# Altium footprint library LION.PcbLib: 90 footprints (part 8 of 13) (continued)
## FFG1158 [mil] "FFG1158" (continued)
  lines w15: -669.3,-551.2 -649.6,-531.5 ; -669.3,-393.7 -649.6,-374 ; -669.3,-157.5 -649.6,-137.8 ; -669.3,39.4 -649.6,19.7 ; -669.3,275.6 -649.6,255.9 ; -669.3,433.1 -649.6,413.4 ; -669.3,669.3 -649.6,649.6 ; -669.25,-629.85 -649.6,-610.2 ; -669.25,-472.45 -649.6,-452.8 ; -669.25,-314.95 -649.6,-295.3 ; -669.25,-236.15 -649.6,-216.5 ; -669.25,-78.75 -649.6,-59.1 ; -669.25,118.05 -649.6,98.4 ; -669.25,196.85 -649.6,177.2 ; -669.25,354.25 -649.6,334.6 ; -669.25,511.75 -649.6,492.1 ; -669.25,590.55 -649.6,570.9 ; -629.85,-629.85 -610.2,-610.2 ; -629.85,-551.15 -610.2,-531.5 ; -629.85,-472.45 -610.2,-452.8 ; -629.85,-393.65 -610.2,-374 ; -629.85,-314.95 -610.2,-295.3 ; -629.85,-236.15 -610.2,-216.5 ; -629.85,-157.45 -610.2,-137.8 ; -629.85,-78.75 -610.2,-59.1 ; -629.85,39.35 -610.2,19.7 ; -629.85,196.85 -610.2,177.2 ; -629.85,275.55 -610.2,255.9 ; -629.85,354.25 -610.2,334.6 ; -629.85,433.05 -610.2,413.4 ; -629.85,511.75 -610.2,492.1 ; -629.85,590.55 -610.2,570.9 ; -629.85,669.25 -610.2,649.6 ; -600.15,-1515.23 -571.15,-1515.23 ; -600.15,-1475.87 -571.15,-1475.87 ; -600.15,-1436.51 -571.15,-1436.51 ; -590.55,-669.25 -570.9,-649.6 ; -590.55,-590.55 -570.9,-570.9 ; -590.55,-511.75 -570.9,-492.1 ; -590.55,-433.05 -570.9,-413.4 ; -590.55,-354.25 -570.9,-334.6 ; -590.55,-275.55 -570.9,-255.9 ; -590.55,-196.85 -570.9,-177.2 ; -590.55,-118.05 -570.9,-98.4 ; -590.55,-39.35 -570.9,-19.7 ; -590.55,157.45 -570.9,137.8 ; -590.55,236.15 -570.9,216.5 ; -590.55,314.95 -570.9,295.3 ; -590.55,393.65 -570.9,374 ; -590.55,472.45 -570.9,452.8 ; -590.55,551.15 -570.9,531.5 ; -590.55,629.85 -570.9,610.2 ; -551.2,-669.3 -531.5,-649.6 ; -551.2,-433.1 -531.5,-413.4 ; -551.2,-275.6 -531.5,-255.9 ; -551.2,-39.4 -531.5,-19.7 ; -551.2,157.5 -531.5,137.8 ; -551.2,393.7 -531.5,374 ; -551.2,551.2 -531.5,531.5 ; -551.15,-590.55 -531.5,-570.9 ; -551.15,-511.75 -531.5,-492.1 ; -551.15,-354.25 -531.5,-334.6 ; -551.15,-196.85 -531.5,-177.2 ; -551.15,-118.05 -531.5,-98.4 ; -551.15,78.75 -531.5,59.1 ; -551.15,236.15 -531.5,216.5 ; -551.15,314.95 -531.5,295.3 ; -551.15,472.45 -531.5,452.8 ; -551.15,629.85 -531.5,610.2 ; -531.15,-1515.23 -502.15,-1515.23 ; -531.15,-1436.51 -502.15,-1436.51 ; -531.15,-1082.27 -502.15,-1082.27 ; -531.15,-1042.91 -502.15,-1042.91 ; -511.75,-629.85 -492.1,-610.2 ; -511.75,-551.15 -492.1,-531.5 ; -511.75,-472.45 -492.1,-452.8 ; -511.75,-393.65 -492.1,-374 ; -511.75,-314.95 -492.1,-295.3 ; -511.75,-236.15 -492.1,-216.5 ; -511.75,-157.45 -492.1,-137.8 ; -511.75,-78.75 -492.1,-59.1 ; -511.75,39.35 -492.1,19.7 ; -511.75,118.05 -492.1,98.4 ; -511.75,196.85 -492.1,177.2 ; -511.75,275.55 -492.1,255.9 ; -511.75,354.25 -492.1,334.6 ; -511.75,433.05 -492.1,413.4 ; -511.75,511.75 -492.1,492.1 ; -511.75,590.55 -492.1,570.9 ; -511.75,669.25 -492.1,649.6 ; -508.46,-1723.26 -508.46,-1684.26 ; -508.46,-1644.26 -508.46,-1605.26 ; -472.45,-629.85 -452.8,-610.2 ; -472.45,-551.15 -452.8,-531.5 ; -472.45,-472.45 -452.8,-452.8 ; -472.45,-393.65 -452.8,-374 ; -472.45,-314.95 -452.8,-295.3 ; -472.45,-236.15 -452.8,-216.5 ; -472.45,-157.45 -452.8,-137.8 ; -472.45,-78.75 -452.8,-59.1 ; -472.45,39.35 -452.8,19.7 ; -472.45,118.05 -452.8,98.4 ; -472.45,196.85 -452.8,177.2 ; -472.45,275.55 -452.8,255.9 ; -472.45,354.25 -452.8,334.6 ; -472.45,433.05 -452.8,413.4 ; -472.45,511.75 -452.8,492.1 ; -472.45,590.55 -452.8,570.9 ; -472.45,669.25 -452.8,649.6 ; -468.46,-1723.26 -468.46,-1684.26 ; -468.46,-1644.26 -468.46,-1605.26 ; -433.1,-669.3 -413.4,-649.6 ; -433.1,-551.2 -413.4,-531.5 ; -433.1,-433.1 -413.4,-413.4 ; -433.1,-393.7 -413.4,-374 ; -433.1,-275.6 -413.4,-255.9 ; -433.1,-39.4 -413.4,-19.7 ; -433.1,157.5 -413.4,137.8 ; -433.1,393.7 -413.4,374 ; -433.1,551.2 -413.4,531.5 ; -433.1,669.3 -413.4,649.6 ; -433.05,-629.85 -413.4,-610.2 ; -433.05,-590.55 -413.4,-570.9 ; -433.05,-511.75 -413.4,-492.1 ; -433.05,-472.45 -413.4,-452.8 ; -433.05,-354.25 -413.4,-334.6 ; -433.05,-196.85 -413.4,-177.2 ; -433.05,-118.05 -413.4,-98.4 ; -433.05,78.75 -413.4,59.1 ; -433.05,236.15 -413.4,216.5 ; -433.05,314.95 -413.4,295.3 ; -433.05,472.45 -413.4,452.8 ; -433.05,511.75 -413.4,492.1 ; -433.05,590.55 -413.4,570.9 ; -433.05,629.85 -413.4,610.2 ; -393.7,-669.3 -374,-649.6 ; -393.7,-433.1 -374,-413.4 ; -393.7,-393.7 -374,-374 ; -393.7,-275.6 -374,-255.9 ; -393.7,-39.4 -374,-19.7 ; -393.7,157.5 -374,137.8 ; -393.7,393.7 -374,374 ; -393.7,433.1 -374,413.4 ; -393.7,551.2 -374,531.5 ; -393.65,-472.45 -374,-452.8 ; -393.65,-354.25 -374,-334.6 ; -393.65,-196.85 -374,-177.2 ; -393.65,-118.05 -374,-98.4 ; -393.65,78.75 -374,59.1 ; -393.65,236.15 -374,216.5 ; -393.65,314.95 -374,295.3 ; -393.65,472.45 -374,452.8 ; -354.4,-1377.49 -334.72,-1357.81 ; -354.4,-1180.65 -334.72,-1200.33 ; -354.25,-590.55 -334.6,-570.9 ; -354.25,-433.05 -334.6,-413.4 ; -354.25,-393.65 -334.6,-374 ; -354.25,-354.25 -334.6,-334.6 ; -354.25,-314.95 -334.6,-295.3 ; -354.25,-275.55 -334.6,-255.9 ; -354.25,-236.15 -334.6,-216.5 ; -354.25,-196.85 -334.6,-177.2 ; -354.25,-157.45 -334.6,-137.8 ; -354.25,-118.05 -334.6,-98.4 ; -354.25,-78.75 -334.6,-59.1 ; -354.25,-39.35 -334.6,-19.7 ; -354.25,39.35 -334.6,19.7 ; -354.25,78.75 -334.6,59.1 ; -354.25,118.05 -334.6,98.4 ; -354.25,157.45 -334.6,137.8 ; -354.25,196.85 -334.6,177.2 ; -354.25,236.15 -334.6,216.5 ; -354.25,275.55 -334.6,255.9 ; -354.25,314.95 -334.6,295.3 ; -354.25,354.25 -334.6,334.6 ; -354.25,393.65 -334.6,374 ; -354.25,433.05 -334.6,413.4 ; -354.25,472.45 -334.6,452.8 ; -354.25,629.85 -345.3,620.9 ; -315.03,-1377.49 -295.35,-1357.81 ; -315.03,-1338.12 -295.35,-1318.44 ; -315.03,-1298.75 -295.35,-1279.07 ; -315.03,-1220.02 -295.35,-1239.7 ; -315.03,-1180.65 -295.35,-1200.33 ; -314.95,-511.75 -295.3,-492.1 ; -314.95,-433.05 -295.3,-413.4 ; -314.95,-275.55 -295.3,-255.9 ; -314.95,-236.15 -295.3,-216.5 ; -314.95,118.05 -295.3,98.4 ; -314.95,314.95 -295.3,295.3 ; -275.66,-1377.49 -255.98,-1357.81 ; -275.66,-1338.12 -255.98,-1318.44 ; -275.66,-1298.75 -255.98,-1279.07 ; -275.66,-1220.02 -255.98,-1239.7 ; -275.66,-1180.65 -255.98,-1200.33 ; -275.6,-433.1 -255.9,-413.4 ; -275.6,-275.6 -255.9,-255.9 ; -275.6,-157.5 -255.9,-137.8 ; -275.6,-39.4 -255.9,-19.7 ; -275.6,39.4 -255.9,19.7 ; -275.55,-629.85 -255.9,-610.2 ; -275.55,-196.85 -255.9,-177.2 ; -275.55,-118.05 -255.9,-98.4 ; -275.55,-78.75 -255.9,-59.1 ; -275.55,78.75 -255.9,59.1 ; -275.55,196.85 -255.9,177.2 ; -275.55,590.55 -255.9,570.9 ; -236.29,-1377.49 -216.61,-1357.81 ; -236.29,-1298.75 -216.61,-1279.07 ; -236.29,-1180.65 -216.61,-1200.33 ; -236.15,-551.15 -216.5,-531.5 ; -236.15,-354.25 -216.5,-334.6 ; -236.15,-275.55 -216.5,-255.9 ; -236.15,-236.15 -216.5,-216.5 ; -236.15,-196.85 -216.5,-177.2 ; -236.15,-157.45 -216.5,-137.8 ; -236.15,-118.05 -216.5,-98.4 ; -236.15,-78.75 -216.5,-59.1 ; -236.15,-39.35 -216.5,-19.7 ; -236.15,39.35 -216.5,19.7 ; -236.15,78.75 -216.5,59.1 ; -236.15,118.05 -216.5,98.4 ; -236.15,472.45 -216.5,452.8 ; -196.92,-1377.49 -177.24,-1357.81 ; -196.92,-1298.75 -177.24,-1279.07 ; -196.92,-1180.65 -177.24,-1200.33 ; -196.85,-669.25 -177.2,-649.6 ; -196.85,-472.45 -177.2,-452.8 ; -196.85,-236.15 -177.2,-216.5 ; -196.85,-157.45 -177.2,-137.8 ; -196.85,-78.75 -177.2,-59.1 ; -196.85,39.35 -177.2,19.7 ; -196.85,78.75 -177.2,59.1 ; -196.85,354.25 -177.2,334.6 ; -157.55,-1456.23 -137.87,-1436.55 ; -157.55,-1416.86 -137.87,-1397.18 ; -157.55,-1377.49 -137.87,-1357.81 ; -157.55,-1298.75 -137.87,-1279.07 ; -157.55,-1180.65 -137.87,-1200.33 ; -157.55,-1141.28 -137.87,-1160.96 ; -157.55,-1101.91 -137.87,-1121.59 ; -157.5,-393.7 -137.8,-374 ; -157.5,-39.4 -137.8,-19.7 ; -157.5,39.4 -137.8,19.7 ; -157.45,-590.55 -137.8,-570.9 ; -157.45,-472.45 -137.8,-452.8 ; -157.45,-196.85 -137.8,-177.2 ; -157.45,-118.05 -137.8,-98.4 ; -157.45,78.75 -137.8,59.1 ; -157.45,118.05 -137.8,98.4 ; -157.45,236.15 -137.8,216.5 ; -157.45,629.85 -137.8,610.2 ; -118.05,-511.75 -98.4,-492.1 ; -118.05,-314.95 -98.4,-295.3 ; -118.05,-275.55 -98.4,-255.9 ; -118.05,-236.15 -98.4,-216.5 ; -118.05,-196.85 -98.4,-177.2 ; -118.05,-157.45 -98.4,-137.8 ; -118.05,-118.05 -98.4,-98.4 ; -118.05,-78.75 -98.4,-59.1 ; -118.05,-39.35 -98.4,-19.7 ; -118.05,39.35 -98.4,19.7 ; -118.05,78.75 -98.4,59.1 ; -118.05,118.05 -98.4,98.4 ; -118.05,511.75 -98.4,492.1 ; -98.5,-1357.81 -78.82,-1377.49 ; -98.5,-1279.07 -78.82,-1298.75 ; -98.5,-1200.33 -78.82,-1180.65 ; -78.75,-629.85 -59.1,-610.2 ; -78.75,-433.05 -59.1,-413.4 ; -78.75,-393.65 -59.1,-374 ; -78.75,-236.15 -59.1,-216.5 ; -78.75,-196.85 -59.1,-177.2 ; -78.75,-157.45 -59.1,-137.8 ; -78.75,-118.05 -59.1,-98.4 ; -78.75,-78.75 -59.1,-59.1 ; -78.75,-39.35 -59.1,-19.7 ; -78.75,39.35 -59.1,19.7 ; -78.75,78.75 -59.1,59.1 ; -78.75,118.05 -59.1,98.4 ; -78.75,393.65 -59.1,374 ; -78.75,590.55 -69.7,581.5 ; -59.13,-1357.81 -39.45,-1377.49 ; -59.13,-1279.07 -39.45,-1298.75 ; -59.13,-1200.33 -39.45,-1180.65 ; -39.4,-551.2 -19.7,-531.5 ; -39.4,-275.6 -19.7,-255.9 ; -39.4,39.4 -19.7,19.7 ; -39.4,275.6 -19.7,255.9 ; -39.4,669.3 -19.7,649.6 ; -39.35,-354.25 -19.7,-334.6 ; -39.35,-236.15 -19.7,-216.5 ; -39.35,-196.85 -19.7,-177.2 ; -39.35,78.75 -19.7,59.1 ; -39.35,118.05 -19.7,98.4 ; -19.76,-1357.81 -0.08,-1377.49 ; -19.76,-1318.44 -0.08,-1338.12 ; -19.76,-1279.07 -0.08,-1298.75 ; -19.76,-1239.7 -0.08,-1220.02 ; -19.76,-1200.33 -0.08,-1180.65 ; 19.61,-1357.81 39.29,-1377.49 ; 19.61,-1318.44 39.29,-1338.12 ; 19.61,-1279.07 39.29,-1298.75 ; 19.61,-1239.7 39.29,-1220.02 ; 19.61,-1200.33 39.29,-1180.65 ; 19.7,-649.6 39.4,-669.3 ; 19.7,-452.8 39.35,-472.45 ; 19.7,-216.5 39.35,-236.15 ; 19.7,-177.2 39.35,-196.85 ; 19.7,19.7 39.4,39.4 ; 19.7,59.1 39.35,78.75 ; 19.7,98.4 39.35,118.05 ; 19.7,137.8 39.4,157.5 ; 19.7,531.5 39.4,551.2 ; 58.98,-1357.81 78.66,-1377.49 ; 58.98,-1200.33 78.66,-1180.65 ; 59.1,-570.9 78.75,-590.55 ; 59.1,-374 78.75,-393.65 ; 59.1,-255.9 78.75,-275.55 ; 59.1,-216.5 78.75,-236.15 ; 59.1,-177.2 78.75,-196.85 ; 59.1,-137.8 78.75,-157.45 ; 59.1,-98.4 78.75,-118.05 ; 59.1,-59.1 78.75,-78.75 ; 59.1,-19.7 78.75,-39.35 ; 59.1,19.7 78.75,39.35 ; 59.1,59.1 78.75,78.75 ; 59.1,98.4 78.75,118.05 ; 59.1,413.4 78.75,433.05 ; 98.4,-492.1 118.05,-511.75 ; 98.4,-295.3 118.05,-314.95 ; 98.4,-255.9 118.05,-275.55 ; 98.4,-177.2 118.05,-196.85 ; 98.4,-98.4 118.05,-118.05 ; 98.4,-19.7 118.05,-39.35 ; 98.4,59.1 118.05,78.75 ; 98.4,98.4 118.05,118.05 ; 98.4,295.3 118.05,314.95 ; 137.8,-610.2 157.45,-629.85 ; 137.8,-413.4 157.5,-433.1 ; 137.8,-374 157.5,-393.7 ; 137.8,-255.9 157.5,-275.6 ; 137.8,-216.5 157.45,-236.15 ; 137.8,-177.2 157.45,-196.85 ; 137.8,-137.8 157.5,-157.5 ; 137.8,-98.4 157.45,-118.05 ; 137.8,-59.1 157.45,-78.75 ; 137.8,19.7 157.5,39.4 ; 137.8,59.1 157.45,78.75 ; 137.8,98.4 157.45,118.05 ; 137.8,177.2 157.45,196.85 ; 137.8,570.9 157.45,590.55 ; 177.2,-531.5 196.85,-551.15 ; 177.2,-334.6 196.85,-354.25 ; 177.2,-255.9 196.85,-275.55 ; 177.2,-216.5 196.85,-236.15 ; 177.2,-177.2 196.85,-196.85 ; 177.2,-137.8 196.85,-157.45 ; 177.2,-98.4 196.85,-118.05 ; 177.2,-59.1 196.85,-78.75 ; 177.2,-19.7 196.85,-39.35 ; 177.2,19.7 196.85,39.35 ; 177.2,59.1 196.85,78.75 ; 177.2,98.4 196.85,118.05 ; 177.2,452.8 196.85,472.45 ; 216.5,-649.6 236.15,-669.25 ; 216.5,-452.8 236.15,-472.45 ; 216.5,-255.9 236.15,-275.55 ; 216.5,-216.5 236.15,-236.15 ; 216.5,-177.2 236.15,-196.85 ; 216.5,-137.8 236.15,-157.45 ; 216.5,-98.4 236.15,-118.05 ; 216.5,-59.1 236.15,-78.75 ; 216.5,-19.7 236.15,-39.35 ; 216.5,19.7 236.15,39.35 ; 216.5,59.1 236.15,78.75 ; 216.5,334.6 236.15,354.25 ; 216.5,531.5 236.15,551.15 ; 255.9,-570.9 275.55,-590.55 ; 255.9,-374 275.6,-393.7 ; 255.9,-255.9 275.6,-275.6 ; 255.9,-216.5 275.55,-236.15 ; 255.9,-177.2 275.55,-196.85 ; 255.9,-137.8 275.6,-157.5 ; 255.9,-98.4 275.55,-118.05 ; 255.9,-59.1 275.55,-78.75 ; 255.9,-19.7 275.6,-39.4 ; 255.9,19.7 275.6,39.4 ; 255.9,59.1 275.55,78.75 ; 255.9,98.4 275.55,118.05 ; 255.9,216.5 275.55,236.15 ; 255.9,610.2 275.55,629.85 ; 295.3,-492.1 314.95,-511.75 ; 295.3,-295.3 314.95,-314.95 ; 295.3,-255.9 314.95,-275.55 ; 295.3,-216.5 314.95,-236.15 ; 295.3,59.1 314.95,78.75 ; 295.3,492.1 314.95,511.75 ; 324.81,-1475.87 353.81,-1475.87 ; 324.81,-1436.51 353.81,-1436.51 ; 324.81,-1397.15 353.81,-1397.15 ; 324.81,-1357.79 353.81,-1357.79 ; 324.81,-1318.43 353.81,-1318.43 ; 324.81,-1239.71 353.81,-1239.71 ; 324.81,-1200.35 353.81,-1200.35 ; 324.81,-1160.99 353.81,-1160.99 ; 324.81,-1121.63 353.81,-1121.63 ; 324.81,-1082.27 353.81,-1082.27 ; 334.6,-610.2 354.25,-629.85 ; 334.6,-413.4 354.25,-433.05 ; 334.6,-374 354.25,-393.65 ; 334.6,-334.6 354.25,-354.25 ; 334.6,-295.3 354.25,-314.95 ; 334.6,-255.9 354.25,-275.55 ; 334.6,-216.5 354.25,-236.15 ; 334.6,-177.2 354.25,-196.85 ; 334.6,-137.8 354.25,-157.45 ; 334.6,-98.4 354.25,-118.05 ; 334.6,-59.1 354.25,-78.75 ; 334.6,-19.7 354.25,-39.35 ; 334.6,19.7 354.25,39.35 ; 334.6,59.1 354.25,78.75 ; 334.6,98.4 354.25,118.05 ; 334.6,137.8 354.25,157.45 ; 334.6,177.2 354.25,196.85 ; 334.6,216.5 354.25,236.15 ; 334.6,255.9 354.25,275.55 ; 334.6,295.3 354.25,314.95 ; 334.6,334.6 354.25,354.25 ; 334.6,374 354.25,393.65 ; 334.6,413.4 354.25,433.05 ; 334.6,452.8 354.25,472.45 ; 374,-531.5 393.7,-551.2 ; 374,-413.4 393.7,-433.1 ; 374,-334.6 393.65,-354.25 ; 374,-255.9 393.7,-275.6 ; 374,-177.2 393.65,-196.85 ; 374,-98.4 393.65,-118.05 ; 374,-19.7 393.7,-39.4 ; 374,59.1 393.65,78.75 ; 374,137.8 393.7,157.5 ; 374,216.5 393.65,236.15 ; 374,295.3 393.65,314.95 ; 374,374 393.7,393.7 ; 374,413.4 393.7,433.1 ; 374,452.8 393.65,472.45 ; 374,649.6 393.7,669.3 ; 393.81,-1475.87 422.81,-1475.87 ; 393.81,-1436.51 422.81,-1436.51 ; 393.81,-1397.15 422.81,-1397.15 ; 393.81,-1357.79 422.81,-1357.79 ; 393.81,-1318.43 422.81,-1318.43 ; 393.81,-1239.71 422.81,-1239.71 ; 393.81,-1200.35 422.81,-1200.35 ; 393.81,-1160.99 422.81,-1160.99 ; 393.81,-1121.63 422.81,-1121.63 ; 393.81,-1082.27 422.81,-1082.27 ; 413.4,-649.6 433.1,-669.3 ; 413.4,-610.2 433.05,-629.85 ; 413.4,-570.9 433.05,-590.55 ; 413.4,-531.5 433.1,-551.2 ; 413.4,-492.1 433.05,-511.75 ; 413.4,-452.8 433.05,-472.45 ; 413.4,-413.4 433.1,-433.1 ; 413.4,-374 433.1,-393.7 ; 413.4,-334.6 433.05,-354.25 ; 413.4,-255.9 433.1,-275.6 ; 413.4,-177.2 433.05,-196.85 ; 413.4,-98.4 433.05,-118.05 ; 413.4,-19.7 433.1,-39.4 ; 413.4,59.1 433.05,78.75 ; 413.4,137.8 433.1,157.5 ; 413.4,216.5 433.05,236.15 ; 413.4,295.3 433.05,314.95 ; 413.4,374 433.1,393.7 ; 413.4,452.8 433.05,472.45 ; 413.4,492.1 433.05,511.75 ; 413.4,531.5 433.1,551.2 ; 413.4,570.9 433.05,590.55 ; 413.4,610.2 433.05,629.85 ; 413.4,649.6 433.1,669.3 ; 452.8,-610.2 472.45,-629.85 ; 452.8,-531.5 472.45,-551.15 ; 452.8,-452.8 472.45,-472.45 ; 452.8,-374 472.45,-393.65 ; 452.8,-295.3 472.45,-314.95 ; 452.8,-216.5 472.45,-236.15 ; 452.8,-137.8 472.45,-157.45 ; 452.8,-59.1 472.45,-78.75 ; 452.8,19.7 472.45,39.35 ; 452.8,98.4 472.45,118.05 ; 452.8,177.2 472.45,196.85 ; 452.8,255.9 472.45,275.55 ; 452.8,334.6 472.45,354.25 ; 452.8,413.4 472.45,433.05 ; 452.8,492.1 472.45,511.75 ; 452.8,570.9 472.45,590.55 ; 452.8,649.6 472.45,669.25 ; 492.1,-610.2 511.75,-629.85 ; 492.1,-531.5 511.75,-551.15 ; 492.1,-452.8 511.75,-472.45 ; 492.1,-374 511.75,-393.65 ; 492.1,-295.3 511.75,-314.95 ; 492.1,-216.5 511.75,-236.15 ; 492.1,-137.8 511.75,-157.45 ; 492.1,-59.1 511.75,-78.75 ; 492.1,19.7 511.75,39.35 ; 492.1,98.4 511.75,118.05 ; 492.1,177.2 511.75,196.85 ; 492.1,255.9 511.75,275.55 ; 492.1,334.6 511.75,354.25 ; 492.1,413.4 511.75,433.05 ; 492.1,492.1 511.75,511.75 ; 492.1,570.9 511.75,590.55 ; 492.1,649.6 511.75,669.25 ; 531.5,-649.6 551.2,-669.3 ; 531.5,-570.9 551.15,-590.55 ; 531.5,-492.1 551.15,-511.75 ; 531.5,-413.4 551.2,-433.1 ; 531.5,-334.6 551.15,-354.25 ; 531.5,-177.2 551.15,-196.85 ; 531.5,-98.4 551.15,-118.05 ; 531.5,-19.7 551.2,-39.4 ; 531.5,59.1 551.15,78.75 ; 531.5,137.8 551.2,157.5 ; 531.5,216.5 551.15,236.15 ; 531.5,295.3 551.15,314.95 ; 531.5,374 551.2,393.7 ; 531.5,452.8 551.15,472.45 ; 531.5,531.5 551.2,551.2 ; 531.5,610.2 551.15,629.85 ; 551.18,-275.55 551.25,-275.55 570.9,-255.9 ; 570.9,-649.6 590.55,-669.25 ; 570.9,-570.9 590.55,-590.55 ; 570.9,-492.1 590.55,-511.75 ; 570.9,-413.4 590.55,-433.05 ; 570.9,-334.6 590.55,-354.25 ; 570.9,-177.2 590.55,-196.85 ; 570.9,-98.4 590.55,-118.05 ; 570.9,-19.7 590.55,-39.35 ; 570.9,59.1 590.55,78.75 ; 570.9,137.8 590.55,157.45 ; 570.9,216.5 590.55,236.15 ; 570.9,295.3 590.55,314.95 ; 570.9,374 590.55,393.65 ; 570.9,452.8 590.55,472.45 ; 570.9,531.5 590.55,551.15 ; 570.9,610.2 590.55,629.85 ; 610.2,-610.2 629.85,-629.85 ; 610.2,-531.5 629.85,-551.15 ; 610.2,-452.8 629.85,-472.45 ; 610.2,-374 629.85,-393.65 ; 610.2,-295.3 629.85,-314.95 ; 610.2,-216.5 629.85,-236.15 ; 610.2,-137.8 629.85,-157.45 ; 610.2,-59.1 629.85,-78.75 ; 610.2,19.7 629.85,39.35 ; 610.2,98.4 629.85,118.05 ; 610.2,177.2 629.85,196.85 ; 610.2,255.9 629.85,275.55 ; 610.2,334.6 629.85,354.25 ; 610.2,413.4 629.85,433.05 ; 610.2,492.1 629.85,511.75 ; 610.2,570.9 629.85,590.55 ; 610.2,649.6 629.85,669.25 ; 649.6,-610.2 669.25,-629.85 ; 649.6,-531.5 669.3,-551.2 ; 649.6,-452.8 669.25,-472.45 ; 649.6,-374 669.3,-393.7 ; 649.6,-295.3 669.25,-314.95 ; 649.6,-216.5 669.25,-236.15 ; 649.6,-137.8 669.3,-157.5 ; 649.6,-59.1 669.25,-78.75 ; 649.6,19.7 669.3,39.4 ; 649.6,98.4 669.25,118.05 ; 649.6,177.2 669.25,196.85 ; 649.6,255.9 669.3,275.6 ; 649.6,334.6 669.25,354.25 ; 649.6,413.4 669.3,433.1 ; 649.6,492.1 669.25,511.75 ; 649.6,570.9 669.25,590.55 ; 649.6,649.6 669.3,669.3
Bottom Layer:
  lines w15: -531.15,-1475.87 -502.15,-1475.87 ; -531.15,-1121.63 -502.15,-1121.63 ; -216.66,-1545.5 -216.66,-1515.5 ; -216.66,-1042.54 -216.66,-1012.54 ; -177.3,-1042.54 -177.3,-1012.54 ; -177.23,-1545.55 -177.23,-1515.55 ; -118.26,-1010.36 -118.26,-979.36 ; -98.51,-1545.55 -98.51,-1515.55 ; 0,-732.62 0,-701.62 ; 0,-479.18 0,-448.18
Top Overlay:
  circle w5: c-700,706 r5.39
  circle w5: c-695,705 r2.83
  circle w5: c-701,706 r4.47
  circle w5: c-697,705 r4.47
  circle w5: c-699,705 r7.81
  circle w5: c-699,706 r11.18
  circle w5: c-699,705 r14.42
  lines w1: -689,-689 -689,689 689,689 689,-689 -689,-689
  lines w3.9: -688,659 -659,688 ; -689,-689 689,-689 689,689 -689,689 -689,-689
  lines w8: -688,683 -684,687 -677,687 -687,677 -687,672 -672,687 -667,687 -687,667 -687,664 -663,688 -659,688
Mechanical 5:
  circle w5: c-699,705 r14.42
  circle w5: c-699,706 r11.18
  circle w5: c-699,705 r7.81
  circle w5: c-697,705 r4.47
  circle w5: c-701,706 r4.47
  circle w5: c-695,705 r2.83
  circle w5: c-700,706 r5.39
  lines w1: -689,-689 -689,689 689,689 689,-689 -689,-689
  lines w3.9: -688,659 -659,688 ; -689,-689 689,-689 689,689 -689,689 -689,-689
  lines w8: -688,683 -684,687 -677,687 -687,677 -687,672 -672,687 -667,687 -687,667 -687,664 -663,688 -659,688
  text "U12" at 767.38,588.57 h25
Mechanical 14:
  text "B9" at -334.6,618.2 h10
  text "E10" at -295.3,504.1 h10
  text "H11" at -255.9,386 h10
  text "AC11" at -255.9,-200.5 h10
  text "AE10" at -295.3,-279.3 h10
  text "L12" at -216.5,267.9 h10
  text "L22" at 177.2,267.9 h10
  text "D23" at 216.5,543.5 h10
  text "A12" at -216.5,661.6 h10
  text "D13" at -177.2,543.5 h10
  text "G14" at -137.8,425.4 h10
  text "C16" at -59.1,582.9 h10
  text "B19" at 59.1,622.2 h10
  text "E20" at 98.4,504.1 h10
  text "F17" at -19.7,464.8 h10
  text "J18" at 19.7,346.6 h10
  text "K15" at -98.4,307.3 h10
  text "H21" at 137.8,386 h10
  text "C26" at 334.6,582.9 h10
  text "A22" at 177.2,661.6 h10
  text "G24" at 255.9,425.4 h10
  text "K25" at 295.3,307.3 h10
  text "Y13" at -177.2,-86.4 h10
  text "AA14" at -137.8,-121.8 h10
  text "V13" at -177.2,-7.7 h10
  text "W14" at -137.8,-47.1 h10
  text "P13" at -177.2,149.8 h10
  text "AD13" at -177.2,-239.9 h10
  text "AB13" at -177.2,-161.2 h10
  text "AC14" at -137.8,-200.5 h10
  text "N16" at -59.1,189.2 h10
  text "M19" at 59.1,228.5 h10
  text "U20" at 98.4,31.7 h10
  text "AB21" at 137.8,-161.2 h10
  text "AA20" at 98.4,-121.8 h10
  text "V21" at 137.8,-7.7 h10
  text "Y21" at 137.8,-86.4 h10
  text "W20" at 98.4,-47.1 h10
  text "AD21" at 137.8,-239.9 h10
  text "AC20" at 98.4,-200.5 h10
  text "P23" at 216.5,149.8 h10
  text "B2" at -610.2,618.2 h10
  text "L10" at -295.3,267.9 h10
  text "N19" at 59.1,189.2 h10
  text "N18" at 19.7,189.2 h10
  text "J15" at -98.4,346.6 h10
  text "H12" at -216.5,386 h10
  text "L11" at -255.9,267.9 h10
  text "A10" at -295.3,661.6 h10
  text "D11" at -255.9,543.5 h10
  text "D10" at -295.3,543.5 h10
  text "F11" at -255.9,464.8 h10
  text "G11" at -255.9,425.4 h10
  text "F15" at -98.4,464.8 h10
  text "F14" at -137.8,464.8 h10
  text "F6" at -452.8,460.8 h10
  text "F5" at -492.1,460.8 h10
  text "K6" at -452.8,303.3 h10
  text "J3" at -570.9,342.6 h10
  text "J4" at -531.5,342.6 h10
  text "H6" at -452.8,382 h10
  text "H5" at -492.1,382 h10
  text "K5" at -492.1,303.3 h10
  text "P30" at 492.1,149.8 h10
  text "R32" at 570.9,110.4 h10
  text "T30" at 492.1,71.1 h10
  text "P29" at 452.8,149.8 h10
  text "L31" at 531.5,267.9 h10
  text "T29" at 452.8,71.1 h10
  text "L32" at 570.9,267.9 h10
  text "R31" at 531.5,110.4 h10
  text "N23" at 216.5,189.2 h10
  text "AJ24" at 255.9,-436.8 h10
  text "AJ27" at 374,-436.8 h10
  text "AG25" at 295.3,-358 h10
  text "AF25" at 295.3,-318.6 h10
  text "AF21" at 137.8,-318.6 h10
  text "AK26" at 334.6,-476.1 h10
  text "AJ26" at 334.6,-436.8 h10
  text "AJ12" at -216.5,-436.8 h10
  text "AK12" at -216.5,-476.1 h10
  text "AA17" at -19.7,-121.8 h10
  text "AA18" at 19.7,-121.8 h10
  text "W18" at 19.7,-47.1 h10
  text "Y17" at -19.7,-86.4 h10
  text "H20" at 98.4,386 h10
  text "AG11" at -255.9,-358 h10
  text "G31" at 531.5,425.4 h10
  text "H33" at 610.2,386 h10
  text "K33" at 610.2,307.3 h10
  text "M33" at 610.2,228.5 h10
  text "G32" at 570.9,425.4 h10
  text "H34" at 649.6,386 h10
  text "K34" at 649.6,307.3 h10
  text "M34" at 649.6,228.5 h10
  text "N31" at 531.5,189.2 h10
  text "P33" at 610.2,149.8 h10
  text "T33" at 610.2,71.1 h10
  text "U31" at 531.5,31.7 h10
  text "N32" at 570.9,189.2 h10
  text "P34" at 649.6,149.8 h10
  text "T34" at 649.6,71.1 h10
  text "U32" at 570.9,31.7 h10
  text "G4" at -531.5,421.4 h10
  text "H2" at -610.2,382 h10
  text "K2" at -610.2,303.3 h10
  text "M2" at -610.2,224.5 h10
  text "G3" at -570.9,421.4 h10
  text "H1" at -649.6,382 h10
  text "K1" at -649.6,303.3 h10
  text "M1" at -649.6,224.5 h10
  text "N4" at -531.5,185.2 h10
  text "P2" at -610.2,145.8 h10
  text "T2" at -610.2,67.1 h10
  text "U4" at -531.5,27.7 h10
  text "N3" at -570.9,185.2 h10
  text "P1" at -649.6,145.8 h10
  text "T1" at -649.6,67.1 h10
  text "U3" at -570.9,27.7 h10
  text "K29" at 452.8,307.3 h10
  text "J31" at 531.5,346.6 h10
  text "H29" at 452.8,386 h10
  text "J32" at 570.9,346.6 h10
  text "K30" at 492.1,307.3 h10
  text "M30" at 492.1,228.5 h10
  text "F29" at 452.8,464.8 h10
  text "R27" at 374,110.4 h10
  text "F30" at 492.1,464.8 h10
  text "R28" at 413.4,110.4 h10
  text "M29" at 452.8,228.5 h10
  text "H30" at 492.1,386 h10
  text "M5" at -492.1,224.5 h10
  text "L3" at -570.9,263.9 h10
  text "T6" at -452.8,67.1 h10
  text "L4" at -531.5,263.9 h10
  text "R4" at -531.5,106.4 h10
  text "R3" at -570.9,106.4 h10
  text "M6" at -452.8,224.5 h10
  text "P6" at -452.8,145.8 h10
  text "P5" at -492.1,145.8 h10
  text "T5" at -492.1,67.1 h10
  text "R8" at -374,106.4 h10
  text "R7" at -413.4,106.4 h10
  text "AD33" at 610.2,-239.9 h10
  text "AD34" at 649.6,-239.9 h10
  text "AF33" at 610.2,-318.6 h10
  text "AF34" at 649.6,-318.6 h10
  text "AJ32" at 570.9,-436.8 h10
  text "AJ31" at 531.5,-436.8 h10
  text "AH34" at 649.6,-397.4 h10
  text "AH33" at 610.2,-397.4 h10
  text "AM34" at 649.6,-554.9 h10
  text "AN32" at 570.9,-594.2 h10
  text "AN31" at 531.5,-594.2 h10
  text "AP34" at 649.6,-633.6 h10
  text "AK34" at 649.6,-476.1 h10
  text "AP33" at 610.2,-633.6 h10
  text "AM33" at 610.2,-554.9 h10
  text "AK33" at 610.2,-476.1 h10
  text "C24" at 255.9,582.9 h10
  text "A26" at 334.6,661.6 h10
  text "B26" at 334.6,622.2 h10
  text "A24" at 255.9,661.6 h10
  text "A23" at 216.5,661.6 h10
  text "AB25" at 295.3,-161.2 h10
  text "AA25" at 295.3,-121.8 h10
  text "T10" at -295.3,71.1 h10
  text "AB10" at -295.3,-161.2 h10
  text "H22" at 177.2,386 h10
  text "E19" at 59.1,504.1 h10
  text "N24" at 255.9,189.2 h10
  text "B21" at 137.8,622.2 h10
  text "F19" at 59.1,464.8 h10
  text "P10" at -295.3,149.8 h10
  text "C2" at -610.2,578.9 h10
  text "D3" at -570.9,539.5 h10
  text "M3" at -570.9,224.5 h10
  text "H3" at -570.9,382 h10
  text "L2" at -610.2,263.9 h10
  text "T3" at -570.9,67.1 h10
  text "Y3" at -570.9,-90.4 h10
  text "R2" at -610.2,106.4 h10
  text "W2" at -610.2,-51.1 h10
  text "AC2" at -610.2,-204.5 h10
  text "AD3" at -570.9,-243.9 h10
  text "AG2" at -610.2,-362 h10
  text "AL2" at -610.2,-519.5 h10
  text "G8" at -374,421.4 h10
  text "AH3" at -570.9,-401.4 h10
  text "AM3" at -570.9,-558.9 h10
  text "G2" at -610.2,421.4 h10
  text "G27" at 374,425.4 h10
  text "D32" at 570.9,543.5 h10
  text "L33" at 610.2,267.9 h10
  text "M32" at 570.9,228.5 h10
  text "T32" at 570.9,71.1 h10
  text "R33" at 610.2,110.4 h10
  text "G33" at 610.2,425.4 h10
  text "H32" at 570.9,386 h10
  text "C33" at 610.2,582.9 h10
  text "Y32" at 570.9,-86.4 h10
  text "AD32" at 570.9,-239.9 h10
  text "AC33" at 610.2,-200.5 h10
  text "AG33" at 610.2,-358 h10
  text "W33" at 610.2,-47.1 h10
  text "AM32" at 570.9,-554.9 h10
  text "AL33" at 610.2,-515.5 h10
  text "AH32" at 570.9,-397.4 h10
  text "N25" at 295.3,189.2 h10
  text "E6" at -452.8,500.1 h10
  text "C6" at -452.8,578.9 h10
  text "N6" at -452.8,185.2 h10
  text "G6" at -452.8,421.4 h10
  text "J6" at -452.8,342.6 h10
  text "L6" at -452.8,263.9 h10
  text "R6" at -452.8,106.4 h10
  text "AA29" at 452.8,-121.8 h10
  text "AC29" at 452.8,-200.5 h10
  text "AJ29" at 452.8,-436.8 h10
  text "AG29" at 452.8,-358 h10
  text "AE29" at 452.8,-279.3 h10
  text "AN29" at 452.8,-594.2 h10
  text "AL29" at 452.8,-515.5 h10
  text "K23" at 216.5,307.3 h10
  text "C29" at 452.8,582.9 h10
  text "E29" at 452.8,504.1 h10
  text "G29" at 452.8,425.4 h10
  text "J29" at 452.8,346.6 h10
  text "L29" at 452.8,267.9 h10
  text "N29" at 452.8,189.2 h10
  text "R29" at 452.8,110.4 h10
  text "U6" at -452.8,27.7 h10
  text "W6" at -452.8,-51.1 h10
  text "U29" at 452.8,31.7 h10
  text "W29" at 452.8,-47.1 h10
  text "C18" at 19.7,582.9 h10
  text "B22" at 177.2,622.2 h10
  text "C12" at -216.5,582.9 h10
  text "E9" at -334.6,500.1 h10
  text "B18" at 19.7,622.2 h10
  text "F18" at 19.7,464.8 h10
  text "C13" at -177.2,582.9 h10
  text "A21" at 137.8,661.6 h10
  text "C22" at 177.2,582.9 h10
  text "E8" at -374,500.1 h10
  text "E18" at 19.7,504.1 h10
  text "C19" at 59.1,582.9 h10
  text "AA6" at -452.8,-125.8 h10
  text "AE6" at -452.8,-283.3 h10
  text "AG6" at -452.8,-362 h10
  text "AJ6" at -452.8,-440.8 h10
  text "AC6" at -452.8,-204.5 h10
  text "AN6" at -452.8,-598.2 h10
  text "AL6" at -452.8,-519.5 h10
  text "AL13" at -177.2,-515.5 h10
  text "AN12" at -216.5,-594.2 h10
  text "G21" at 137.8,425.4 h10
  text "AN25" at 295.3,-594.2 h10
  text "F20" at 98.4,464.8 h10
  text "AG15" at -98.4,-358 h10
  text "P17" at -19.7,149.8 h10
  text "AP27" at 374,-633.6 h10
  text "AG20" at 98.4,-358 h10
  text "AD18" at 19.7,-239.9 h10
  text "V10" at -295.3,-7.7 h10
  text "AE21" at 137.8,-279.3 h10
  text "C23" at 216.5,582.9 h10
  text "AP10" at -295.3,-633.6 h10
  text "R13" at -177.2,110.4 h10
  text "AM26" at 334.6,-554.9 h10
  text "U25" at 295.3,31.7 h10
  text "R25" at 295.3,110.4 h10
  text "AM23" at 216.5,-554.9 h10
  text "W17" at -19.7,-47.1 h10
  text "AN19" at 59.1,-594.2 h10
  text "R23" at 216.5,110.4 h10
  text "AA10" at -295.3,-121.8 h10
  text "AF19" at 59.1,-318.6 h10
  text "U10" at -295.3,31.7 h10
  text "AN8" at -374,-598.2 h10
  text "Y25" at 295.3,-86.4 h10
  text "AN13" at -177.2,-594.2 h10
  text "W25" at 295.3,-47.1 h10
  text "AM12" at -216.5,-554.9 h10
  text "J7" at -413.4,342.6 h10
  text "F21" at 137.8,464.8 h10
  text "AA4" at -531.5,-125.8 h10
  text "V5" at -492.1,-11.7 h10
  text "AE17" at -19.7,-279.3 h10
  text "AB5" at -492.1,-165.2 h10
  text "AM6" at -452.8,-558.9 h10
  text "D21" at 137.8,543.5 h10
  text "AL4" at -531.5,-519.5 h10
  text "AF10" at -295.3,-318.6 h10
  text "W8" at -374,-51.1 h10
  text "AJ19" at 59.1,-436.8 h10
  text "AD5" at -492.1,-243.9 h10
  text "AL26" at 334.6,-515.5 h10
  text "AG4" at -531.5,-362 h10